# Altium footprint library NXP_60_26022015.PCBLIB: 287 footprints (part 7 of 18)
Each footprint in its own frame and in the unit in brackets; x right, y up, seen from the top. Pads: shape width x height; smd on the part's side, far side on the other; paste and mask are expansions set on the pad; w line width, h text height; cw(c..) or ccw(c..) is an arc to the next point about the centre after c.
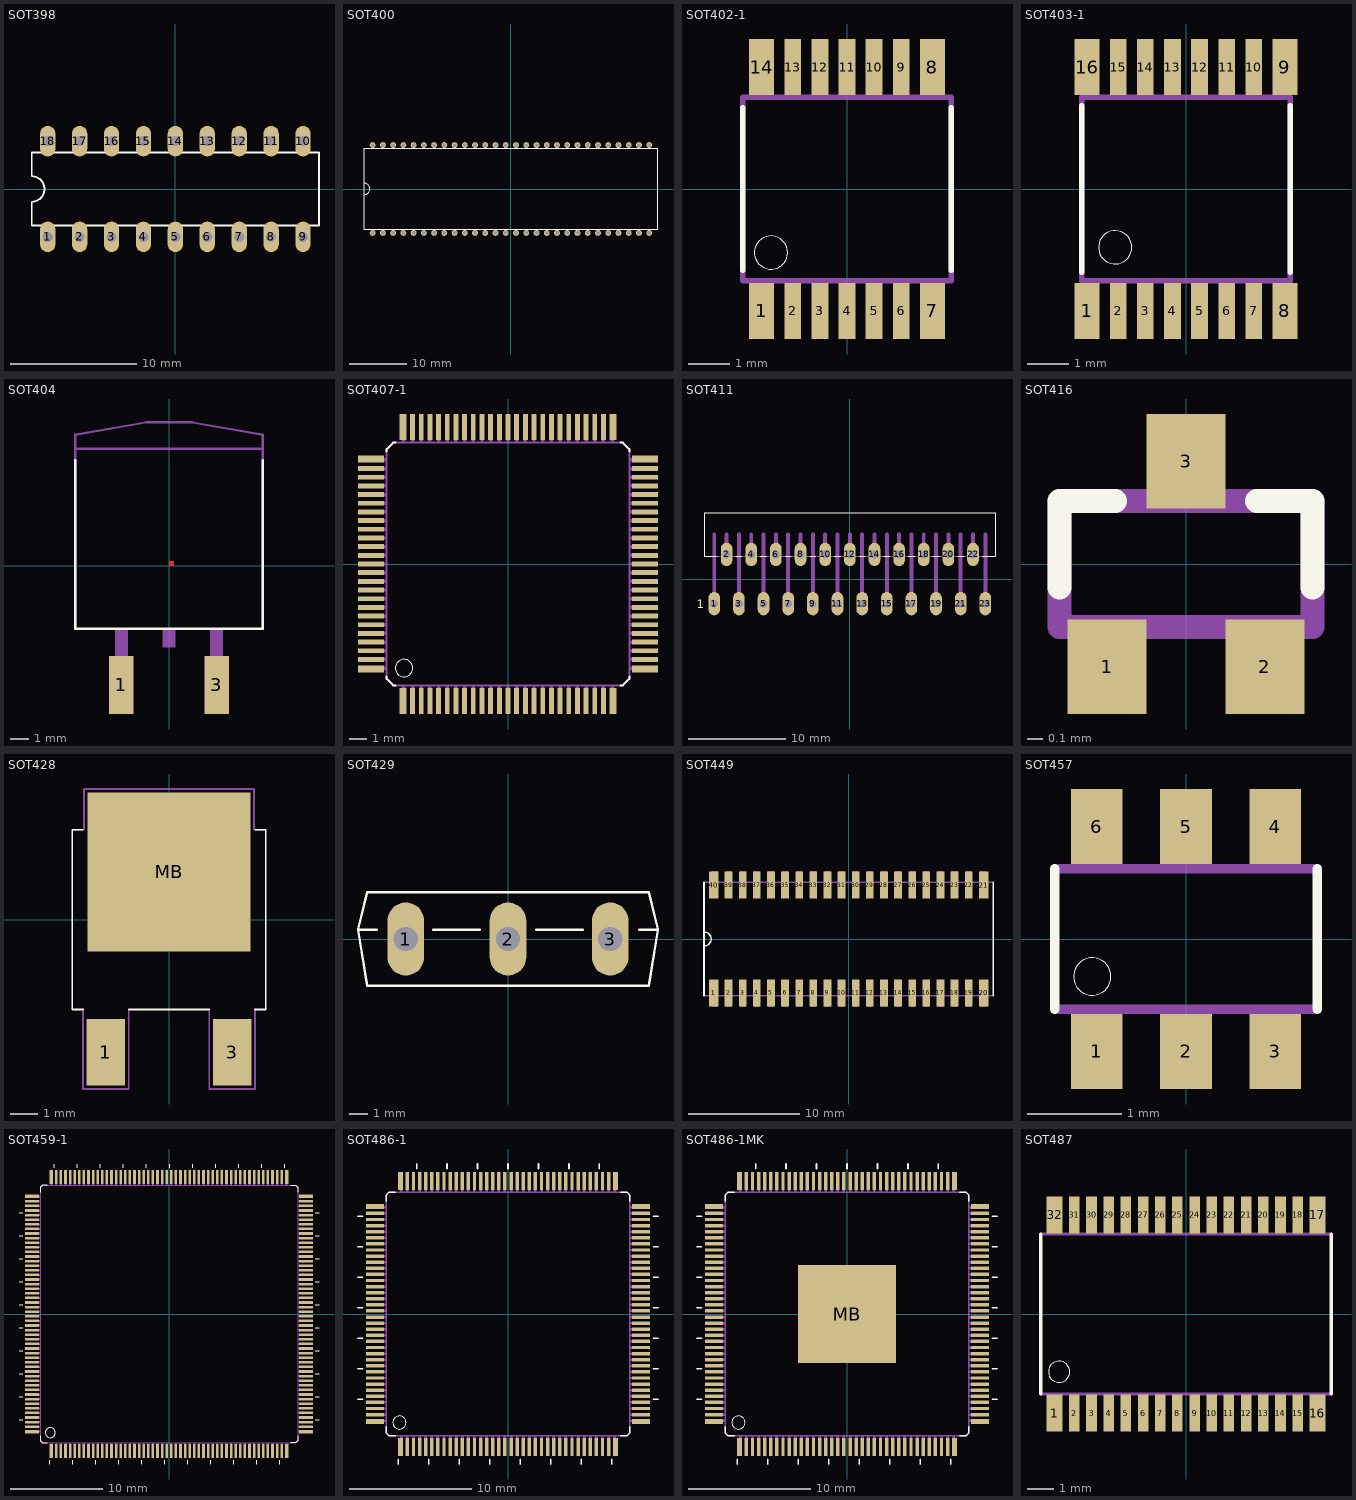
[diagram p6: the footprints below, top view; thin cyan lines are the x and y axes]

## SOT398 [mil]
pads (18):
  oval 48x96 hole 32: 1(-400,-150) 2(-300,-150) 3(-200,-150) 4(-100,-150) 5(0,-150) 6(100,-150) 7(200,-150) 8(300,-150) 9(400,-150) 10(400,150) 11(300,150) 12(200,150) 13(100,150) 14(0,150) 15(-100,150) 16(-200,150) 17(-300,150) 18(-400,150)
Top Overlay:
  lines w6: -450,-115 450,-115 450,115 -450,115 -450,40 cw(c-450,0) -450,-40 -450,-115

## SOT400 [mil]
pads (56):
  round 40 hole 24: 1(-945,-300) 2(-875,-300) 3(-805,-300) 4(-735,-300) 5(-665,-300) 6(-595,-300) 7(-525,-300) 8(-455,-300) 9(-385,-300) 10(-315,-300) 11(-245,-300) 12(-175,-300) 13(-105,-300) 14(-35,-300) 15(35,-300) 16(105,-300) 17(175,-300) 18(245,-300) 19(315,-300) 20(385,-300) 21(455,-300) 22(525,-300) 23(595,-300) 24(665,-300) 25(735,-300) 26(805,-300) 27(875,-300) 28(945,-300) 29(945,300) 30(875,300) 31(805,300) 32(735,300) 33(665,300) 34(595,300) 35(525,300) 36(455,300) 37(385,300) 38(315,300) 39(245,300) 40(175,300) 41(105,300) 42(35,300) 43(-35,300) 44(-105,300) 45(-175,300) 46(-245,300) 47(-315,300) 48(-385,300) 49(-455,300) 50(-525,300) 51(-595,300) 52(-665,300) 53(-735,300) 54(-805,300) 55(-875,300) 56(-945,300)
Top Overlay:
  lines w5: -1005.04,-39.5 -1005.04,40.5 ; -1005.04,-39.5 -1005.04,-275.59 1005.04,-275.59 1005.04,275.59 -1005.04,275.59 -1005.04,40.5 ; -1005.04,-39.5 ccw(c-1005.04,0.5) -1005.04,40.5

## SOT402-1 [mm]
pads (14):
  rect 0.6x1.35 smd: 1(-2.05,-2.925) 7(2.05,-2.925) 8(2.05,2.925) 14(-2.05,2.925)
  rect 0.4x1.35 smd: 2(-1.3,-2.925) 3(-0.65,-2.925) 4(0,-2.925) 5(0.65,-2.925) 6(1.3,-2.925) 9(1.3,2.925) 10(0.65,2.925) 11(0,2.925) 12(-0.65,2.925) 13(-1.3,2.925)
Top Overlay:
  circle w0: c-1.825,-1.525 r0.4
  lines w0.127: -2.5,-1.95 -2.5,1.95 ; 2.5,-1.95 2.5,1.95
Mechanical 16:
  rectangle: -2.125,2.2 -1.775,3.2
  rectangle: -1.475,2.2 -1.125,3.2
  rectangle: -2.125,-3.2 -1.775,-2.2
  rectangle: -0.825,2.2 -0.475,3.2
  rectangle: -0.175,2.2 0.175,3.2
  rectangle: 0.475,2.2 0.825,3.2
  rectangle: 1.125,2.2 1.475,3.2
  rectangle: 1.775,2.2 2.125,3.2
  rectangle: -1.475,-3.2 -1.125,-2.2
  rectangle: -0.825,-3.2 -0.475,-2.2
  rectangle: -0.175,-3.2 0.175,-2.2
  rectangle: 0.475,-3.2 0.825,-2.2
  rectangle: 1.125,-3.2 1.475,-2.2
  rectangle: 1.775,-3.2 2.125,-2.2
  lines w0.127: -2.5,-2.2 2.5,-2.2 2.5,2.2 -2.5,2.2 -2.5,-2.2

## SOT403-1 [mm]
pads (16):
  rect 0.6x1.35 smd: 1(-2.375,-2.925) 8(2.375,-2.925) 9(2.375,2.925) 16(-2.375,2.925)
  rect 0.4x1.35 smd: 2(-1.625,-2.925) 3(-0.975,-2.925) 4(-0.325,-2.925) 5(0.325,-2.925) 6(0.975,-2.925) 7(1.625,-2.925) 10(1.625,2.925) 11(0.975,2.925) 12(0.325,2.925) 13(-0.325,2.925) 14(-0.975,2.925) 15(-1.625,2.925)
Top Overlay:
  circle w0: c-1.7,-1.4 r0.4
  lines w0.127: -2.5,-2 -2.5,2 ; 2.5,-2 2.5,2
Mechanical 16:
  rectangle: -2.45,2.2 -2.1,3.2
  rectangle: -1.8,2.2 -1.45,3.2
  rectangle: -2.45,-3.2 -2.1,-2.2
  rectangle: -1.15,2.2 -0.8,3.2
  rectangle: -0.5,2.2 -0.15,3.2
  rectangle: 0.15,2.2 0.5,3.2
  rectangle: 0.8,2.2 1.15,3.2
  rectangle: 1.45,2.2 1.8,3.2
  rectangle: 2.1,2.2 2.45,3.2
  rectangle: -1.8,-3.2 -1.45,-2.2
  rectangle: -1.15,-3.2 -0.8,-2.2
  rectangle: -0.5,-3.2 -0.15,-2.2
  rectangle: 0.15,-3.2 0.5,-2.2
  rectangle: 0.8,-3.2 1.15,-2.2
  rectangle: 1.45,-3.2 1.8,-2.2
  rectangle: 2.1,-3.2 2.45,-2.2
  lines w0.127: -2.5,-2.2 2.5,-2.2 2.5,2.2 -2.5,2.2 -2.5,-2.2

## SOT404 [mm]
pads (3):
  rect 1.3x3.1 smd: 1(-2.54,-6.35) 3(2.54,-6.35)
  rect 0x0 smd: MB(0,0)
Top Layer:
  region: 0,0 0.254,0 0.254,0.254 0,0.254
Top Overlay:
  lines w0.127: -5,5.625 -5,-3.35 5,-3.35 5,5.625
Top Paste:
  rectangle: -1.65,5.95 -0.15,8.1
  rectangle: -3.45,5.95 -1.95,8.1
  rectangle: -5.25,5.95 -3.75,8.1
  rectangle: 0.15,5.95 1.65,8.1
  rectangle: 1.95,5.95 3.45,8.1
  rectangle: 3.75,5.95 5.25,8.1
  rectangle: -1.8,2.85 -0.1,4.35
  rectangle: 0.1,2.85 1.8,4.35
  rectangle: 2,2.85 3.7,4.35
  rectangle: -3.7,2.85 -2,4.35
  rectangle: -3.7,-0.25 -2,1.25
  rectangle: -1.8,-0.25 -0.1,1.25
  rectangle: 0.1,-0.25 1.8,1.25
  rectangle: 2,-0.25 3.7,1.25
Top Solder:
  region: 0,0 0.254,0 0.254,0.254 0,0.254
Mechanical 16:
  rectangle: -2.89,-7.65 -2.19,-3.35
  rectangle: 2.19,-7.65 2.89,-3.35
  rectangle: -0.35,-4.35 0.35,-3.35
  lines w0.127: -5,-3.35 -5,6.25 ; 5,-3.35 5,6.25 ; -5,6.25 5,6.25 ; -5,6.25 -5,7 -1.25,7.65 1.25,7.65 5,7 5,6.25

## SOT407-1 [mm]
pads (100):
  rect 0.4x1.5 smd: 1(-6.06,-7.9) 25(6.06,-7.9) 51(6.06,7.9) 75(-6.06,7.9)
  rect 0.28x1.5 smd: 2(-5.5,-7.9) 3(-5,-7.9) 4(-4.5,-7.9) 5(-4,-7.9) 6(-3.5,-7.9) 7(-3,-7.9) 8(-2.5,-7.9) 9(-2,-7.9) 10(-1.5,-7.9) 11(-1,-7.9) 12(-0.5,-7.9) 13(0,-7.9) 14(0.5,-7.9) 15(1,-7.9) 16(1.5,-7.9) 17(2,-7.9) 18(2.5,-7.9) 19(3,-7.9) 20(3.5,-7.9) 21(4,-7.9) 22(4.5,-7.9) 23(5,-7.9) 24(5.5,-7.9) 52(5.5,7.9) 53(5,7.9) 54(4.5,7.9) 55(4,7.9) 56(3.5,7.9) 57(3,7.9) 58(2.5,7.9) 59(2,7.9) 60(1.5,7.9) 61(1,7.9) 62(0.5,7.9) 63(0,7.9) 64(-0.5,7.9) 65(-1,7.9) 66(-1.5,7.9) 67(-2,7.9) 68(-2.5,7.9) 69(-3,7.9) 70(-3.5,7.9) 71(-4,7.9) 72(-4.5,7.9) 73(-5,7.9) 74(-5.5,7.9)
  rect 1.5x0.4 smd: 26(7.9,-6.06) 50(7.9,6.06) 76(-7.9,6.06) 100(-7.9,-6.06)
  rect 1.5x0.28 smd: 27(7.9,-5.5) 28(7.9,-5) 29(7.9,-4.5) 30(7.9,-4) 31(7.9,-3.5) 32(7.9,-3) 33(7.9,-2.5) 34(7.9,-2) 35(7.9,-1.5) 36(7.9,-1) 37(7.9,-0.5) 38(7.9,0) 39(7.9,0.5) 40(7.9,1) 41(7.9,1.5) 42(7.9,2) 43(7.9,2.5) 44(7.9,3) 45(7.9,3.5) 46(7.9,4) 47(7.9,4.5) 48(7.9,5) 49(7.9,5.5) 77(-7.9,5.5) 78(-7.9,5) 79(-7.9,4.5) 80(-7.9,4) 81(-7.9,3.5) 82(-7.9,3) 83(-7.9,2.5) 84(-7.9,2) 85(-7.9,1.5) 86(-7.9,1) 87(-7.9,0.5) 88(-7.9,0) 89(-7.9,-0.5) 90(-7.9,-1) 91(-7.9,-1.5) 92(-7.9,-2) 93(-7.9,-2.5) 94(-7.9,-3) 95(-7.9,-3.5) 96(-7.9,-4) 97(-7.9,-4.5) 98(-7.9,-5) 99(-7.9,-5.5)
Top Overlay:
  circle w0: c-6,-6 r0.5
  lines w0.127: -7,-6.5 -7,-6.625 -6.625,-7 -6.5,-7 ; -7,6.5 -7,6.625 -6.625,7 -6.5,7 ; 6.5,-7 6.625,-7 7,-6.625 7,-6.5 ; 6.5,7 6.625,7 7,6.625 7,6.5
Mechanical 16:
  rectangle: -0.6,7 -0.4,8
  rectangle: -0.1,7 0.1,8
  rectangle: 0.4,7 0.6,8
  rectangle: 0.9,7 1.1,8
  rectangle: 1.4,7 1.6,8
  rectangle: 1.9,7 2.1,8
  rectangle: 2.4,7 2.6,8
  rectangle: 2.9,7 3.1,8
  rectangle: 3.4,7 3.6,8
  rectangle: 3.9,7 4.1,8
  rectangle: -1.1,7 -0.9,8
  rectangle: -1.6,7 -1.4,8
  rectangle: -2.1,7 -1.9,8
  rectangle: -2.6,7 -2.4,8
  rectangle: -3.1,7 -2.9,8
  rectangle: -3.6,7 -3.4,8
  rectangle: -4.1,7 -3.9,8
  rectangle: -4.6,7 -4.4,8
  rectangle: -5.1,7 -4.9,8
  rectangle: -5.6,7 -5.4,8
  rectangle: -6.1,7 -5.9,8
  rectangle: 4.4,7 4.6,8
  rectangle: 4.9,7 5.1,8
  rectangle: 5.4,7 5.6,8
  rectangle: 5.9,7 6.1,8
  rectangle: -0.6,-8 -0.4,-7
  rectangle: -0.1,-8 0.1,-7
  rectangle: 0.4,-8 0.6,-7
  rectangle: 0.9,-8 1.1,-7
  rectangle: 1.4,-8 1.6,-7
  rectangle: 1.9,-8 2.1,-7
  rectangle: 2.4,-8 2.6,-7
  rectangle: 2.9,-8 3.1,-7
  rectangle: 3.4,-8 3.6,-7
  rectangle: 3.9,-8 4.1,-7
  rectangle: -1.1,-8 -0.9,-7
  rectangle: -1.6,-8 -1.4,-7
  rectangle: -2.1,-8 -1.9,-7
  rectangle: -2.6,-8 -2.4,-7
  rectangle: -3.1,-8 -2.9,-7
  rectangle: -3.6,-8 -3.4,-7
  rectangle: -4.1,-8 -3.9,-7
  rectangle: -4.6,-8 -4.4,-7
  rectangle: -5.1,-8 -4.9,-7
  rectangle: -5.6,-8 -5.4,-7
  rectangle: -6.1,-8 -5.9,-7
  rectangle: 4.4,-8 4.6,-7
  rectangle: 4.9,-8 5.1,-7
  rectangle: 5.4,-8 5.6,-7
  rectangle: 5.9,-8 6.1,-7
  region: 8,-0.6 8,-0.4 7,-0.4 7,-0.6
  region: 8,-0.1 8,0.1 7,0.1 7,-0.1
  region: 8,0.4 8,0.6 7,0.6 7,0.4
  region: 8,0.9 8,1.1 7,1.1 7,0.9
  region: 8,1.4 8,1.6 7,1.6 7,1.4
  region: 8,1.9 8,2.1 7,2.1 7,1.9
  region: 8,2.4 8,2.6 7,2.6 7,2.4
  region: 8,2.9 8,3.1 7,3.1 7,2.9
  region: 8,3.4 8,3.6 7,3.6 7,3.4
  region: 8,3.9 8,4.1 7,4.1 7,3.9
  region: 8,-1.1 8,-0.9 7,-0.9 7,-1.1
  region: 8,-1.6 8,-1.4 7,-1.4 7,-1.6
  region: 8,-2.1 8,-1.9 7,-1.9 7,-2.1
  region: 8,-2.6 8,-2.4 7,-2.4 7,-2.6
  region: 8,-3.1 8,-2.9 7,-2.9 7,-3.1
  region: 8,-3.6 8,-3.4 7,-3.4 7,-3.6
  region: 8,-4.1 8,-3.9 7,-3.9 7,-4.1
  region: 8,-4.6 8,-4.4 7,-4.4 7,-4.6
  region: 8,-5.1 8,-4.9 7,-4.9 7,-5.1
  region: 8,-5.6 8,-5.4 7,-5.4 7,-5.6
  region: 8,-6.1 8,-5.9 7,-5.9 7,-6.1
  region: 8,4.4 8,4.6 7,4.6 7,4.4
  region: 8,4.9 8,5.1 7,5.1 7,4.9
  region: 8,5.4 8,5.6 7,5.6 7,5.4
  region: 8,5.9 8,6.1 7,6.1 7,5.9
  region: -8,0.6 -8,0.4 -7,0.4 -7,0.6
  region: -8,0.1 -8,-0.1 -7,-0.1 -7,0.1
  region: -8,-0.4 -8,-0.6 -7,-0.6 -7,-0.4
  region: -8,-0.9 -8,-1.1 -7,-1.1 -7,-0.9
  region: -8,-1.4 -8,-1.6 -7,-1.6 -7,-1.4
  region: -8,-1.9 -8,-2.1 -7,-2.1 -7,-1.9
  region: -8,-2.4 -8,-2.6 -7,-2.6 -7,-2.4
  region: -8,-2.9 -8,-3.1 -7,-3.1 -7,-2.9
  region: -8,-3.4 -8,-3.6 -7,-3.6 -7,-3.4
  region: -8,-3.9 -8,-4.1 -7,-4.1 -7,-3.9
  region: -8,1.1 -8,0.9 -7,0.9 -7,1.1
  region: -8,1.6 -8,1.4 -7,1.4 -7,1.6
  region: -8,2.1 -8,1.9 -7,1.9 -7,2.1
  region: -8,2.6 -8,2.4 -7,2.4 -7,2.6
  region: -8,3.1 -8,2.9 -7,2.9 -7,3.1
  region: -8,3.6 -8,3.4 -7,3.4 -7,3.6
  region: -8,4.1 -8,3.9 -7,3.9 -7,4.1
  region: -8,4.6 -8,4.4 -7,4.4 -7,4.6
  region: -8,5.1 -8,4.9 -7,4.9 -7,5.1
  region: -8,5.6 -8,5.4 -7,5.4 -7,5.6
  region: -8,6.1 -8,5.9 -7,5.9 -7,6.1
  region: -8,-4.4 -8,-4.6 -7,-4.6 -7,-4.4
  region: -8,-4.9 -8,-5.1 -7,-5.1 -7,-4.9
  region: -8,-5.4 -8,-5.6 -7,-5.6 -7,-5.4
  region: -8,-5.9 -8,-6.1 -7,-6.1 -7,-5.9
  lines w0.127: -7,-6.6 -7,6.6 -6.6,7 6.6,7 7,6.6 7,-6.6 6.6,-7 -6.6,-7 -7,-6.6

## SOT411 [mil]
pads (23):
  oval 47.25x94.5 hole 31.5: 1(-550,-100) 2(-500,100) 3(-450,-100) 4(-400,100) 5(-350,-100) 6(-300,100) 7(-250,-100) 8(-200,100) 9(-150,-100) 10(-100,100) 11(-50,-100) 12(0,100) 13(50,-100) 14(100,100) 15(150,-100) 16(200,100) 17(250,-100) 18(300,100) 19(350,-100) 20(400,100) 21(450,-100) 22(500,100) 23(550,-100)
Top Overlay:
  lines w5: -537.5,92.13 -590.55,92.13 -590.55,269.29 590.55,269.29 590.55,92.13 537.5,92.13 ; -462.5,92.13 -437.5,92.13 ; -362.5,92.13 -337.5,92.13 ; -262.5,92.13 -237.5,92.13 ; -162.5,92.13 -137.5,92.13 ; -62.5,92.13 -37.5,92.13 ; 37.5,92.13 62.5,92.13 ; 137.5,92.13 162.5,92.13 ; 237.5,92.13 262.5,92.13 ; 337.5,92.13 362.5,92.13 ; 437.5,92.13 462.5,92.13
  text "1" at -620.08,-118.9 h33.46
Mechanical 16:
  lines w5: -590.55,92.13 590.55,92.13
  lines w16: -550,-100 -550,180.71 ; -500,100 -500,180.71 ; -450,-100 -450,180.71 ; -400,100 -400,180.71 ; -350,-100 -350,180.71 ; -300,100 -300,180.71 ; -250,-100 -250,180.71 ; -200,100 -200,180.71 ; -150,-100 -150,180.71 ; -100,100 -100,180.71 ; -50,-100 -50,180.71 ; 0,100 0,180.71 ; 50,-100 50,180.71 ; 100,100 100,180.71 ; 150,-100 150,180.71 ; 200,100 200,180.71 ; 250,-100 250,180.71 ; 300,100 300,180.71 ; 350,-100 350,180.71 ; 400,100 400,180.71 ; 450,-100 450,180.71 ; 500,100 500,180.71 ; 550,-100 550,180.71

## SOT416 [mm]
pads (3):
  rect 0.5x0.6 smd: 1(-0.5,-0.65) 2(0.5,-0.65) 3(0,0.65)
Top Overlay:
  lines w0.152: -0.8,-0.15 -0.8,0.4 -0.45,0.4 ; 0.45,0.4 0.8,0.4 0.8,-0.15
Mechanical 16:
  rectangle: -0.6,-0.7 -0.4,-0.4
  rectangle: 0.4,-0.7 0.6,-0.4
  rectangle: -0.1,0.4 0.1,0.7
  lines w0.152: -0.8,-0.4 0.8,-0.4 0.8,0.4 -0.8,0.4 -0.8,-0.4

## SOT428 [mm]
pads (3):
  rect 1.4x2.4 smd: 1(-2.285,-4.8) 3(2.285,-4.8)
  rect 5.9x5.75 smd: MB(0,1.725)
Top Overlay:
  lines w0.06: -3.125,3.25 -3.5,3.25 -3.5,-3.25 -3.11,-3.25 ; -1.46,-3.25 1.46,-3.25 ; 3.11,-3.25 3.5,-3.25 3.5,3.25 3.125,3.25
Top Paste:
  rectangle: -0.9,3.55 0.9,4.55
  rectangle: -2.9,3.55 -1.1,4.55
  rectangle: 1.1,3.55 2.9,4.55
  rectangle: -0.9,1.225 0.9,2.225
  rectangle: -2.9,1.225 -1.1,2.225
  rectangle: 1.1,1.225 2.9,2.225
  rectangle: -2.9,-1.1 -1.1,-0.1
  rectangle: -0.9,-1.1 0.9,-0.1
  rectangle: 1.1,-1.1 2.9,-0.1
  rectangle: -2.935,-4.65 -1.635,-3.65
  rectangle: -2.935,-5.95 -1.635,-4.95
  rectangle: 1.635,-4.65 2.935,-3.65
  rectangle: 1.635,-5.95 2.935,-4.95
Mechanical 16:
  lines w0.06: -3.5,3.25 -3.075,3.25 -3.075,4.725 3.075,4.725 3.075,3.25 3.5,3.25 ; -3.11,-3.25 -3.11,-6.125 -1.46,-6.125 -1.46,-3.25 ; 1.46,-3.25 1.46,-6.125 3.11,-6.125 3.11,-3.25

## SOT429 [mm]
pads (3):
  oval 1.95x3.9 hole 1.3: 1(-5.45,0) 2(0,0) 3(5.45,0)
Top Overlay:
  lines w0.127: -7,0.5 -8,0.5 ; -4,0.5 -1.5,0.5 ; 1.5,0.5 4,0.5 ; 7,0.5 8,0.5 ; -8,0.5 -7.5,2.5 7.5,2.5 8,0.5 ; -8,0.5 -7.5,-2.5 7.5,-2.5 8,0.5

## SOT449 [mm]
pads (40):
  rect 0.85x2.4 smd: 1(-12.14,-4.85) 20(12.14,-4.85) 21(12.14,4.85) 40(-12.14,4.85)
  rect 0.7x2.4 smd: 2(-10.795,-4.85) 3(-9.525,-4.85) 4(-8.255,-4.85) 5(-6.985,-4.85) 6(-5.715,-4.85) 7(-4.445,-4.85) 8(-3.175,-4.85) 9(-1.905,-4.85) 10(-0.635,-4.85) 11(0.635,-4.85) 12(1.905,-4.85) 13(3.175,-4.85) 14(4.445,-4.85) 15(5.715,-4.85) 16(6.985,-4.85) 17(8.255,-4.85) 18(9.525,-4.85) 19(10.795,-4.85) 22(10.795,4.85) 23(9.525,4.85) 24(8.255,4.85) 25(6.985,4.85) 26(5.715,4.85) 27(4.445,4.85) 28(3.175,4.85) 29(1.905,4.85) 30(0.635,4.85) 31(-0.635,4.85) 32(-1.905,4.85) 33(-3.175,4.85) 34(-4.445,4.85) 35(-5.715,4.85) 36(-6.985,4.85) 37(-8.255,4.85) 38(-9.525,4.85) 39(-10.795,4.85)
Top Overlay:
  lines w0.127: -13,-0.635 ccw(c-13,0) -13,0.635
  lines w0.152: -13,-5.1 -13,-0.635 -13,0.635 -13,5.1 ; 13,-5.1 13,5.1
Mechanical 16:
  rectangle: -9.779,5.1 -9.271,6.1
  rectangle: -11.049,5.1 -10.541,6.1
  rectangle: -12.319,5.1 -11.811,6.1
  rectangle: -8.509,5.1 -8.001,6.1
  rectangle: -7.239,5.1 -6.731,6.1
  rectangle: -5.969,5.1 -5.461,6.1
  rectangle: -4.699,5.1 -4.191,6.1
  rectangle: -3.429,5.1 -2.921,6.1
  rectangle: -2.159,5.1 -1.651,6.1
  rectangle: -0.889,5.1 -0.381,6.1
  rectangle: 0.381,5.1 0.889,6.1
  rectangle: 1.651,5.1 2.159,6.1
  rectangle: 2.921,5.1 3.429,6.1
  rectangle: 4.191,5.1 4.699,6.1
  rectangle: 5.461,5.1 5.969,6.1
  rectangle: 6.731,5.1 7.239,6.1
  rectangle: 6.731,5.1 7.239,6.1
  rectangle: 8.001,5.1 8.509,6.1
  rectangle: 10.541,5.1 11.049,6.1
  rectangle: 9.271,5.1 9.779,6.1
  rectangle: 11.811,5.1 12.319,6.1
  rectangle: -12.319,-6.1 -11.811,-5.1
  rectangle: -11.049,-6.1 -10.541,-5.1
  rectangle: -9.779,-6.1 -9.271,-5.1
  rectangle: -8.509,-6.1 -8.001,-5.1
  rectangle: -7.239,-6.1 -6.731,-5.1
  rectangle: -5.969,-6.1 -5.461,-5.1
  rectangle: -4.699,-6.1 -4.191,-5.1
  rectangle: -3.429,-6.1 -2.921,-5.1
  rectangle: -2.159,-6.1 -1.651,-5.1
  rectangle: -0.889,-6.1 -0.381,-5.1
  rectangle: 0.381,-6.1 0.889,-5.1
  rectangle: 1.651,-6.1 2.159,-5.1
  rectangle: 2.921,-6.1 3.429,-5.1
  rectangle: 4.191,-6.1 4.699,-5.1
  rectangle: 5.461,-6.1 5.969,-5.1
  rectangle: 6.731,-6.1 7.239,-5.1
  rectangle: 8.001,-6.1 8.509,-5.1
  rectangle: 9.271,-6.1 9.779,-5.1
  rectangle: 10.541,-6.1 11.049,-5.1
  rectangle: 11.811,-6.1 12.319,-5.1
  lines w0.152: -13,-5.1 13,-5.1 ; -13,5.1 13,5.1

## SOT457 [mil]
pads (6):
  rect 21.65x31.5 smd: 1(-37.4,-47.24) 2(0,-47.24) 3(37.4,-47.24) 4(37.4,47.24) 5(0,47.24) 6(-37.4,47.24)
Top Overlay:
  circle w0: c-39.37,-15.75 r7.87
  lines w4: -55.12,-29.53 -55.12,29.53 ; 55.12,-29.53 55.12,29.53
Mechanical 16:
  rectangle: -44.29,-51.18 -30.51,-30.51
  rectangle: -6.89,-51.18 6.89,-30.51
  rectangle: 30.51,-51.18 44.29,-30.51
  rectangle: 30.51,30.51 44.29,51.18
  rectangle: -6.89,30.51 6.89,51.18
  rectangle: -44.29,30.51 -30.51,51.18
  lines w4: -55.12,-29.53 55.12,-29.53 ; -55.12,29.53 55.12,29.53

## SOT459-1 [mm]
pads (208):
  rect 0.4x1.5 smd: 1(-12.81,-14.9) 52(12.81,-14.9) 105(12.81,14.9) 156(-12.81,14.9)
  rect 0.28x1.5 smd: 2(-12.25,-14.9) 3(-11.75,-14.9) 4(-11.25,-14.9) 5(-10.75,-14.9) 6(-10.25,-14.9) 7(-9.75,-14.9) 8(-9.25,-14.9) 9(-8.75,-14.9) 10(-8.25,-14.9) 11(-7.75,-14.9) 12(-7.25,-14.9) 13(-6.75,-14.9) 14(-6.25,-14.9) 15(-5.75,-14.9) 16(-5.25,-14.9) 17(-4.75,-14.9) 18(-4.25,-14.9) 19(-3.75,-14.9) 20(-3.25,-14.9) 21(-2.75,-14.9) 22(-2.25,-14.9) 23(-1.75,-14.9) 24(-1.25,-14.9) 25(-0.75,-14.9) 26(-0.25,-14.9) 27(0.25,-14.9) 28(0.75,-14.9) 29(1.25,-14.9) 30(1.75,-14.9) 31(2.25,-14.9) 32(2.75,-14.9) 33(3.25,-14.9) 34(3.75,-14.9) 35(4.25,-14.9) 36(4.75,-14.9) 37(5.25,-14.9) 38(5.75,-14.9) 39(6.25,-14.9) 40(6.75,-14.9) 41(7.25,-14.9) 42(7.75,-14.9) 43(8.25,-14.9) 44(8.75,-14.9) 45(9.25,-14.9) 46(9.75,-14.9) 47(10.25,-14.9) 48(10.75,-14.9) 49(11.25,-14.9) 50(11.75,-14.9) 51(12.25,-14.9) 106(12.25,14.9) 107(11.75,14.9) 108(11.25,14.9) 109(10.75,14.9) 110(10.25,14.9) 111(9.75,14.9) 112(9.25,14.9) 113(8.75,14.9) 114(8.25,14.9) 115(7.75,14.9) 116(7.25,14.9) 117(6.75,14.9) 118(6.25,14.9) 119(5.75,14.9) 120(5.25,14.9) 121(4.75,14.9) 122(4.25,14.9) 123(3.75,14.9) 124(3.25,14.9) 125(2.75,14.9) 126(2.25,14.9) 127(1.75,14.9) 128(1.25,14.9) 129(0.75,14.9) 130(0.25,14.9) 131(-0.25,14.9) 132(-0.75,14.9) 133(-1.25,14.9) 134(-1.75,14.9) 135(-2.25,14.9) 136(-2.75,14.9) 137(-3.25,14.9) 138(-3.75,14.9) 139(-4.25,14.9) 140(-4.75,14.9) 141(-5.25,14.9) 142(-5.75,14.9) 143(-6.25,14.9) 144(-6.75,14.9) 145(-7.25,14.9) 146(-7.75,14.9) 147(-8.25,14.9) 148(-8.75,14.9) 149(-9.25,14.9) 150(-9.75,14.9) 151(-10.25,14.9) 152(-10.75,14.9) 153(-11.25,14.9) 154(-11.75,14.9) 155(-12.25,14.9)
  rect 1.5x0.4 smd: 53(14.9,-12.81) 104(14.9,12.81) 157(-14.9,12.81) 208(-14.9,-12.81)
  rect 1.5x0.28 smd: 54(14.9,-12.25) 55(14.9,-11.75) 56(14.9,-11.25) 57(14.9,-10.75) 58(14.9,-10.25) 59(14.9,-9.75) 60(14.9,-9.25) 61(14.9,-8.75) 62(14.9,-8.25) 63(14.9,-7.75) 64(14.9,-7.25) 65(14.9,-6.75) 66(14.9,-6.25) 67(14.9,-5.75) 68(14.9,-5.25) 69(14.9,-4.75) 70(14.9,-4.25) 71(14.9,-3.75) 72(14.9,-3.25) 73(14.9,-2.75) 74(14.9,-2.25) 75(14.9,-1.75) 76(14.9,-1.25) 77(14.9,-0.75) 78(14.9,-0.25) 79(14.9,0.25) 80(14.9,0.75) 81(14.9,1.25) 82(14.9,1.75) 83(14.9,2.25) 84(14.9,2.75) 85(14.9,3.25) 86(14.9,3.75) 87(14.9,4.25) 88(14.9,4.75) 89(14.9,5.25) 90(14.9,5.75) 91(14.9,6.25) 92(14.9,6.75) 93(14.9,7.25) 94(14.9,7.75) 95(14.9,8.25) 96(14.9,8.75) 97(14.9,9.25) 98(14.9,9.75) 99(14.9,10.25) 100(14.9,10.75) 101(14.9,11.25) 102(14.9,11.75) 103(14.9,12.25) 158(-14.9,12.25) 159(-14.9,11.75) 160(-14.9,11.25) 161(-14.9,10.75) 162(-14.9,10.25) 163(-14.9,9.75) 164(-14.9,9.25) 165(-14.9,8.75) 166(-14.9,8.25) 167(-14.9,7.75) 168(-14.9,7.25) 169(-14.9,6.75) 170(-14.9,6.25) 171(-14.9,5.75) 172(-14.9,5.25) 173(-14.9,4.75) 174(-14.9,4.25) 175(-14.9,3.75) 176(-14.9,3.25) 177(-14.9,2.75) 178(-14.9,2.25) 179(-14.9,1.75) 180(-14.9,1.25) 181(-14.9,0.75) 182(-14.9,0.25) 183(-14.9,-0.25) 184(-14.9,-0.75) 185(-14.9,-1.25) 186(-14.9,-1.75) 187(-14.9,-2.25) 188(-14.9,-2.75) 189(-14.9,-3.25) 190(-14.9,-3.75) 191(-14.9,-4.25) 192(-14.9,-4.75) 193(-14.9,-5.25) 194(-14.9,-5.75) 195(-14.9,-6.25) 196(-14.9,-6.75) 197(-14.9,-7.25) 198(-14.9,-7.75) 199(-14.9,-8.25) 200(-14.9,-8.75) 201(-14.9,-9.25) 202(-14.9,-9.75) 203(-14.9,-10.25) 204(-14.9,-10.75) 205(-14.9,-11.25) 206(-14.9,-11.75) 207(-14.9,-12.25)
Top Overlay:
  circle w0: c-12.9,-12.9 r0.538
  lines w0.127: -16.3,-11.5 -15.9,-11.5 ; -16.3,-9 -15.9,-9 ; -16.3,-6.5 -15.9,-6.5 ; -16.3,-4 -15.9,-4 ; -16.3,-1.5 -15.9,-1.5 ; -16.3,1 -15.9,1 ; -16.3,3.5 -15.9,3.5 ; -16.3,6 -15.9,6 ; -16.3,8.5 -15.9,8.5 ; -16.3,11 -15.9,11 ; -14,-13.25 -14,-13.75 -13.75,-14 -13.25,-14 ; -14,13.25 -14,13.75 -13.75,14 -13.25,14 ; -13,-16.3 -13,-15.9 ; -12.5,15.9 -12.5,16.3 ; -10.5,-16.3 -10.5,-15.9 ; -10,15.9 -10,16.3 ; -8,-16.3 -8,-15.9 ; -7.5,15.9 -7.5,16.3 ; -5.5,-16.3 -5.5,-15.9 ; -5,15.9 -5,16.3 ; -3,-16.3 -3,-15.9 ; -2.5,15.9 -2.5,16.3 ; -0.5,-16.3 -0.5,-15.9 ; 0,15.9 0,16.3 ; 2,-16.3 2,-15.9 ; 2.5,15.9 2.5,16.3 ; 4.5,-16.3 4.5,-15.9 ; 5,15.9 5,16.3 ; 7,-16.3 7,-15.9 ; 7.5,15.9 7.5,16.3 ; 9.5,-16.3 9.5,-15.9 ; 10,15.9 10,16.3 ; 12,-16.3 12,-15.9 ; 12.5,15.9 12.5,16.3 ; 13.25,-14 13.75,-14 14,-13.75 14,-13.25 ; 13.25,14 13.75,14 14,13.75 14,13.25 ; 15.9,-11.5 16.3,-11.5 ; 15.9,-9 16.3,-9 ; 15.9,-6.5 16.3,-6.5 ; 15.9,-4 16.3,-4 ; 15.9,-1.5 16.3,-1.5 ; 15.9,1 16.3,1 ; 15.9,3.5 16.3,3.5 ; 15.9,6 16.3,6 ; 15.9,8.5 16.3,8.5 ; 15.9,11 16.3,11
Mechanical 16:
  drawing of 216 lines, arcs and shapes, not listed

## SOT486-1 [mm]
pads (144):
  rect 0.4x1.5 smd: 1(-8.81,-10.9) 36(8.81,-10.9) 73(8.81,10.9) 108(-8.81,10.9)
  rect 0.28x1.5 smd: 2(-8.25,-10.9) 3(-7.75,-10.9) 4(-7.25,-10.9) 5(-6.75,-10.9) 6(-6.25,-10.9) 7(-5.75,-10.9) 8(-5.25,-10.9) 9(-4.75,-10.9) 10(-4.25,-10.9) 11(-3.75,-10.9) 12(-3.25,-10.9) 13(-2.75,-10.9) 14(-2.25,-10.9) 15(-1.75,-10.9) 16(-1.25,-10.9) 17(-0.75,-10.9) 18(-0.25,-10.9) 19(0.25,-10.9) 20(0.75,-10.9) 21(1.25,-10.9) 22(1.75,-10.9) 23(2.25,-10.9) 24(2.75,-10.9) 25(3.25,-10.9) 26(3.75,-10.9) 27(4.25,-10.9) 28(4.75,-10.9) 29(5.25,-10.9) 30(5.75,-10.9) 31(6.25,-10.9) 32(6.75,-10.9) 33(7.25,-10.9) 34(7.75,-10.9) 35(8.25,-10.9) 74(8.25,10.9) 75(7.75,10.9) 76(7.25,10.9) 77(6.75,10.9) 78(6.25,10.9) 79(5.75,10.9) 80(5.25,10.9) 81(4.75,10.9) 82(4.25,10.9) 83(3.75,10.9) 84(3.25,10.9) 85(2.75,10.9) 86(2.25,10.9) 87(1.75,10.9) 88(1.25,10.9) 89(0.75,10.9) 90(0.25,10.9) 91(-0.25,10.9) 92(-0.75,10.9) 93(-1.25,10.9) 94(-1.75,10.9) 95(-2.25,10.9) 96(-2.75,10.9) 97(-3.25,10.9) 98(-3.75,10.9) 99(-4.25,10.9) 100(-4.75,10.9) 101(-5.25,10.9) 102(-5.75,10.9) 103(-6.25,10.9) 104(-6.75,10.9) 105(-7.25,10.9) 106(-7.75,10.9) 107(-8.25,10.9)
  rect 1.5x0.4 smd: 37(10.9,-8.81) 72(10.9,8.81) 109(-10.9,8.81) 144(-10.9,-8.81)
  rect 1.5x0.28 smd: 38(10.9,-8.25) 39(10.9,-7.75) 40(10.9,-7.25) 41(10.9,-6.75) 42(10.9,-6.25) 43(10.9,-5.75) 44(10.9,-5.25) 45(10.9,-4.75) 46(10.9,-4.25) 47(10.9,-3.75) 48(10.9,-3.25) 49(10.9,-2.75) 50(10.9,-2.25) 51(10.9,-1.75) 52(10.9,-1.25) 53(10.9,-0.75) 54(10.9,-0.25) 55(10.9,0.25) 56(10.9,0.75) 57(10.9,1.25) 58(10.9,1.75) 59(10.9,2.25) 60(10.9,2.75) 61(10.9,3.25) 62(10.9,3.75) 63(10.9,4.25) 64(10.9,4.75) 65(10.9,5.25) 66(10.9,5.75) 67(10.9,6.25) 68(10.9,6.75) 69(10.9,7.25) 70(10.9,7.75) 71(10.9,8.25) 110(-10.9,8.25) 111(-10.9,7.75) 112(-10.9,7.25) 113(-10.9,6.75) 114(-10.9,6.25) 115(-10.9,5.75) 116(-10.9,5.25) 117(-10.9,4.75) 118(-10.9,4.25) 119(-10.9,3.75) 120(-10.9,3.25) 121(-10.9,2.75) 122(-10.9,2.25) 123(-10.9,1.75) 124(-10.9,1.25) 125(-10.9,0.75) 126(-10.9,0.25) 127(-10.9,-0.25) 128(-10.9,-0.75) 129(-10.9,-1.25) 130(-10.9,-1.75) 131(-10.9,-2.25) 132(-10.9,-2.75) 133(-10.9,-3.25) 134(-10.9,-3.75) 135(-10.9,-4.25) 136(-10.9,-4.75) 137(-10.9,-5.25) 138(-10.9,-5.75) 139(-10.9,-6.25) 140(-10.9,-6.75) 141(-10.9,-7.25) 142(-10.9,-7.75) 143(-10.9,-8.25)
Top Overlay:
  circle w0: c-8.9,-8.9 r0.538
  lines w0.127: -12.3,-7 -11.9,-7 ; -12.3,-4.5 -11.9,-4.5 ; -12.3,-2 -11.9,-2 ; -12.3,0.5 -11.9,0.5 ; -12.3,3 -11.9,3 ; -12.3,5.5 -11.9,5.5 ; -12.3,8 -11.9,8 ; -10,-9.25 -10,-9.75 -9.75,-10 -9.25,-10 ; -10,9.25 -10,9.75 -9.75,10 -9.25,10 ; -9,-12.3 -9,-11.9 ; -7.5,11.9 -7.5,12.3 ; -6.5,-12.3 -6.5,-11.9 ; -5,11.9 -5,12.3 ; -4,-12.3 -4,-11.9 ; -2.5,11.9 -2.5,12.3 ; -1.5,-12.3 -1.5,-11.9 ; 0,11.9 0,12.3 ; 1,-12.3 1,-11.9 ; 2.5,11.9 2.5,12.3 ; 3.5,-12.3 3.5,-11.9 ; 5,11.9 5,12.3 ; 6,-12.3 6,-11.9 ; 7.5,11.9 7.5,12.3 ; 8.5,-12.3 8.5,-11.9 ; 9.25,-10 9.75,-10 10,-9.75 10,-9.25 ; 9.25,10 9.75,10 10,9.75 10,9.25 ; 11.9,-7 12.3,-7 ; 11.9,-4.5 12.3,-4.5 ; 11.9,-2 12.3,-2 ; 11.9,0.5 12.3,0.5 ; 11.9,3 12.3,3 ; 11.9,5.5 12.3,5.5 ; 11.9,8 12.3,8
Mechanical 16:
  drawing of 152 lines, arcs and shapes, not listed

## SOT486-1MK [mm]
pads (145):
  rect 0.4x1.5 smd: 1(-8.81,-10.9) 36(8.81,-10.9) 73(8.81,10.9) 108(-8.81,10.9)
  rect 0.28x1.5 smd: 2(-8.25,-10.9) 3(-7.75,-10.9) 4(-7.25,-10.9) 5(-6.75,-10.9) 6(-6.25,-10.9) 7(-5.75,-10.9) 8(-5.25,-10.9) 9(-4.75,-10.9) 10(-4.25,-10.9) 11(-3.75,-10.9) 12(-3.25,-10.9) 13(-2.75,-10.9) 14(-2.25,-10.9) 15(-1.75,-10.9) 16(-1.25,-10.9) 17(-0.75,-10.9) 18(-0.25,-10.9) 19(0.25,-10.9) 20(0.75,-10.9) 21(1.25,-10.9) 22(1.75,-10.9) 23(2.25,-10.9) 24(2.75,-10.9) 25(3.25,-10.9) 26(3.75,-10.9) 27(4.25,-10.9) 28(4.75,-10.9) 29(5.25,-10.9) 30(5.75,-10.9) 31(6.25,-10.9) 32(6.75,-10.9) 33(7.25,-10.9) 34(7.75,-10.9) 35(8.25,-10.9) 74(8.25,10.9) 75(7.75,10.9) 76(7.25,10.9) 77(6.75,10.9) 78(6.25,10.9) 79(5.75,10.9) 80(5.25,10.9) 81(4.75,10.9) 82(4.25,10.9) 83(3.75,10.9) 84(3.25,10.9) 85(2.75,10.9) 86(2.25,10.9) 87(1.75,10.9) 88(1.25,10.9) 89(0.75,10.9) 90(0.25,10.9) 91(-0.25,10.9) 92(-0.75,10.9) 93(-1.25,10.9) 94(-1.75,10.9) 95(-2.25,10.9) 96(-2.75,10.9) 97(-3.25,10.9) 98(-3.75,10.9) 99(-4.25,10.9) 100(-4.75,10.9) 101(-5.25,10.9) 102(-5.75,10.9) 103(-6.25,10.9) 104(-6.75,10.9) 105(-7.25,10.9) 106(-7.75,10.9) 107(-8.25,10.9)
  rect 1.5x0.4 smd: 37(10.9,-8.81) 72(10.9,8.81) 109(-10.9,8.81) 144(-10.9,-8.81)
  rect 1.5x0.28 smd: 38(10.9,-8.25) 39(10.9,-7.75) 40(10.9,-7.25) 41(10.9,-6.75) 42(10.9,-6.25) 43(10.9,-5.75) 44(10.9,-5.25) 45(10.9,-4.75) 46(10.9,-4.25) 47(10.9,-3.75) 48(10.9,-3.25) 49(10.9,-2.75) 50(10.9,-2.25) 51(10.9,-1.75) 52(10.9,-1.25) 53(10.9,-0.75) 54(10.9,-0.25) 55(10.9,0.25) 56(10.9,0.75) 57(10.9,1.25) 58(10.9,1.75) 59(10.9,2.25) 60(10.9,2.75) 61(10.9,3.25) 62(10.9,3.75) 63(10.9,4.25) 64(10.9,4.75) 65(10.9,5.25) 66(10.9,5.75) 67(10.9,6.25) 68(10.9,6.75) 69(10.9,7.25) 70(10.9,7.75) 71(10.9,8.25) 110(-10.9,8.25) 111(-10.9,7.75) 112(-10.9,7.25) 113(-10.9,6.75) 114(-10.9,6.25) 115(-10.9,5.75) 116(-10.9,5.25) 117(-10.9,4.75) 118(-10.9,4.25) 119(-10.9,3.75) 120(-10.9,3.25) 121(-10.9,2.75) 122(-10.9,2.25) 123(-10.9,1.75) 124(-10.9,1.25) 125(-10.9,0.75) 126(-10.9,0.25) 127(-10.9,-0.25) 128(-10.9,-0.75) 129(-10.9,-1.25) 130(-10.9,-1.75) 131(-10.9,-2.25) 132(-10.9,-2.75) 133(-10.9,-3.25) 134(-10.9,-3.75) 135(-10.9,-4.25) 136(-10.9,-4.75) 137(-10.9,-5.25) 138(-10.9,-5.75) 139(-10.9,-6.25) 140(-10.9,-6.75) 141(-10.9,-7.25) 142(-10.9,-7.75) 143(-10.9,-8.25)
  rect 8x8 smd: MB(0,0)
Top Overlay:
  circle w0: c-8.9,-8.9 r0.538
  lines w0.127: -12.3,-7 -11.9,-7 ; -12.3,-4.5 -11.9,-4.5 ; -12.3,-2 -11.9,-2 ; -12.3,0.5 -11.9,0.5 ; -12.3,3 -11.9,3 ; -12.3,5.5 -11.9,5.5 ; -12.3,8 -11.9,8 ; -10,-9.25 -10,-9.75 -9.75,-10 -9.25,-10 ; -10,9.25 -10,9.75 -9.75,10 -9.25,10 ; -9,-12.3 -9,-11.9 ; -7.5,11.9 -7.5,12.3 ; -6.5,-12.3 -6.5,-11.9 ; -5,11.9 -5,12.3 ; -4,-12.3 -4,-11.9 ; -2.5,11.9 -2.5,12.3 ; -1.5,-12.3 -1.5,-11.9 ; 0,11.9 0,12.3 ; 1,-12.3 1,-11.9 ; 2.5,11.9 2.5,12.3 ; 3.5,-12.3 3.5,-11.9 ; 5,11.9 5,12.3 ; 6,-12.3 6,-11.9 ; 7.5,11.9 7.5,12.3 ; 8.5,-12.3 8.5,-11.9 ; 9.25,-10 9.75,-10 10,-9.75 10,-9.25 ; 9.25,10 9.75,10 10,9.75 10,9.25 ; 11.9,-7 12.3,-7 ; 11.9,-4.5 12.3,-4.5 ; 11.9,-2 12.3,-2 ; 11.9,0.5 12.3,0.5 ; 11.9,3 12.3,3 ; 11.9,5.5 12.3,5.5 ; 11.9,8 12.3,8
Top Paste:
  rectangle: -3,1 -1,3
  rectangle: 1,1 3,3
  rectangle: 1,-3 3,-1
  rectangle: -3,-3 -1,-1
Mechanical 16:
  drawing of 152 lines, arcs and shapes, not listed

## SOT487 [mm]
pads (32):
  rect 0.6x1.4 smd: 1(-4.975,-3.75) 16(4.975,-3.75) 17(4.975,3.75) 32(-4.975,3.75)
  rect 0.4x1.4 smd: 2(-4.225,-3.75) 3(-3.575,-3.75) 4(-2.925,-3.75) 5(-2.275,-3.75) 6(-1.625,-3.75) 7(-0.975,-3.75) 8(-0.325,-3.75) 9(0.325,-3.75) 10(0.975,-3.75) 11(1.625,-3.75) 12(2.275,-3.75) 13(2.925,-3.75) 14(3.575,-3.75) 15(4.225,-3.75) 18(4.225,3.75) 19(3.575,3.75) 20(2.925,3.75) 21(2.275,3.75) 22(1.625,3.75) 23(0.975,3.75) 24(0.325,3.75) 25(-0.325,3.75) 26(-0.975,3.75) 27(-1.625,3.75) 28(-2.275,3.75) 29(-2.925,3.75) 30(-3.575,3.75) 31(-4.225,3.75)
Top Overlay:
  circle w0: c-4.8,-2.185 r0.4
  lines w0.127: -5.5,-3.025 -5.5,0.5 -5.5,3.025 ; 5.5,-3.025 5.5,0.5 5.5,3.025
Mechanical 16:
  rectangle: -1.1,3.025 -0.85,4.025
  rectangle: -1.75,3.025 -1.5,4.025
  rectangle: -2.4,3.025 -2.15,4.025
  rectangle: -3.05,3.025 -2.8,4.025
  rectangle: -3.7,3.025 -3.45,4.025
  rectangle: -4.35,3.025 -4.1,4.025
  rectangle: -5,3.025 -4.75,4.025
  rectangle: -0.45,3.025 -0.2,4.025
  rectangle: 0.2,3.025 0.45,4.025
  rectangle: 0.85,3.025 1.1,4.025
  rectangle: 1.5,3.025 1.75,4.025
  rectangle: 2.15,3.025 2.4,4.025
  rectangle: 4.1,3.025 4.35,4.025
  rectangle: 4.75,3.025 5,4.025
  rectangle: -1.1,-4.025 -0.85,-3.025
  rectangle: -1.75,-4.025 -1.5,-3.025
  rectangle: -2.4,-4.025 -2.15,-3.025
  rectangle: -3.05,-4.025 -2.8,-3.025
  rectangle: -3.7,-4.025 -3.45,-3.025
  rectangle: -4.35,-4.025 -4.1,-3.025
  rectangle: -5,-4.025 -4.75,-3.025
  rectangle: -0.45,-4.025 -0.2,-3.025
  rectangle: 0.2,-4.025 0.45,-3.025
  rectangle: 0.85,-4.025 1.1,-3.025
  rectangle: 1.5,-4.025 1.75,-3.025
  rectangle: 2.15,-4.025 2.4,-3.025
  rectangle: 4.1,-4.025 4.35,-3.025
  rectangle: 4.75,-4.025 5,-3.025
  rectangle: 2.8,3.025 3.05,4.025
  rectangle: 3.45,3.025 3.7,4.025
  rectangle: 2.8,-4.025 3.05,-3.025
  rectangle: 3.45,-4.025 3.7,-3.025
  lines w0.127: -5.5,-3.025 5.5,-3.025 ; -5.5,3.025 5.5,3.025